# Altium schematic symbol library Electronic Devices_LIB.SchLib: 703 symbols (part 2 of 8) (continued)
## CONN_JST_XH_2P_2.5mm (continued)
XH Series 2.5mm 2 Position Through Hole Shrouded Header Connector; Manufacturer: JST; Current Rating: 3A; Contact Resistance: 20mR; Voltage Rating (AC): 250V; Number of Positions: 2; Insulation Resistance: 1GR; Gender: Male; Wire/Cable Gauge: 22AWG; Manufacturer Part Number: S2B-XH-A(LF)(SN); RoHS: Yes; Category: Headers and Wire Housings; Stock 1: 377; Pricing 1: 1=0.07750, 500=0.07400, 1500=0.07110, 5000=0.06790, 15000=0.06230 (USD); Mount: Through Hole; Contact Material: Brass; Contact Plating: Tin,Lead,Copper; Color: Natural; Housing Color: White; Housing Material: Polyamide; Contact Shape: Square; Contact Finish - Mating: TIN; Insulation Material: Nylon; Insulation Color: Natural; Min Operating Temperature: -25°C; Max Operating Temperature: 85°C; Number of Rows: 1; Voltage Rating: 250V; Termination: Solder; Number of Contacts: 2; Max Current Rating: 3A; Package Quantity: 1000; Packaging: Bulk; Max Voltage Rating (AC): 250V; Max Voltage Rating (DC): 250V; Orientation: Right Angle; Connector Type: Header; Series: XH; Contact Type: Male Pin; Fastening Type: Detent; Length: 7.4mm; Pitch: 2.5mm; Lead Pitch: 2.5mm; Depth: 11.5mm; Reach SVHC Compliant: Yes; Lead Free: Lead Free; Flammability Rating: UL94 V-0; ComponentLink1URL: https://datasheet.ciiva.com/16208/s2b-xh-alfsn-16208978.pdf?src-supplier=Future+Electronics; ComponentLink1Description: https://datasheet.ciiva.com/16208/s2b-xh-alfsn-16208978.pdf?src-supplier=Future+Electronics; ComponentLink2URL: https://datasheet.ciiva.com/26894/getdatasheetpartid-640270-26894603.pdf?src-supplier=Verical; ComponentLink2Description: https://datasheet.ciiva.com/26894/getdatasheetpartid-640270-26894603.pdf?src-supplier=Verical; ComponentLink3URL: https://datasheet.ciiva.com/26894/getdatasheetpartid-441330-26894909.pdf?src-supplier=Verical; ComponentLink3Description: https://datasheet.ciiva.com/26894/getdatasheetpartid-441330-26894909.pdf?src-supplier=Verical; ComponentLink4URL: https://datasheet.ciiva.com/26924/getdatasheetpartid-645395-26924076.pdf?src-supplier=Verical; ComponentLink4Description: https://datasheet.ciiva.com/26924/getdatasheetpartid-645395-26924076.pdf?src-supplier=Verical; ComponentLink5URL: https://datasheet.ciiva.com/8052/1684882-8052211.pdf?src-supplier=Element14; ComponentLink5Description: https://datasheet.ciiva.com/8052/1684882-8052211.pdf?src-supplier=Element14; ComponentLink6URL: https://datasheet.ciiva.com/11746/0900766b8082f560-11746947.pdf?src-supplier=Rs; ComponentLink6Description: https://datasheet.ciiva.com/11746/0900766b8082f560-11746947.pdf?src-supplier=Rs; ComponentLink7URL: https://datasheet.ciiva.com/726/exh-726412.pdf?src-supplier=Digi-Key; ComponentLink7Description: https://datasheet.ciiva.com/726/exh-726412.pdf?src-supplier=Digi-Key; Supplier 1: Future Electronics; Supplier 2: Rs; Supplier 3: Digi-Key; Supplier Part Number 1: 2832053; Supplier Part Number 2: 8201582; Supplier Part Number 3: 455-2257-ND
footprint CONN_JST-S2B-XH-A(LF)(SN)_V (Header, 2-Leads, Body 7.4x11.5mm, Pitch 2.5mm)
pins: 1, 2

## CONN_MICRO_SDCARD_9P
designator J?, comment CONN_SD_CARD 9
CON 9 SD CARD PUSH SMT 1.1MM SP 81H AU; CLASS: IO; AGILE_PN: 211-79878; MFG_NAME01: SHENZHEN ATOM TECHNOLOGY CO.,LTD; MFG_PN01: MR01A-01202; CAD_APPROVED: Yes; PCB Footprint: con9_sdcard_1p1mm; Package Type: SMT; ROHS: Yes; HEIGHT: 2.05 MM
footprint CONN_SDCARD_1P1MM
pins: 1 DAT2, 2 CD/DAT3, 3 CMD, 4 VDD (power), 5 CLK, 6 VSS (power), 7 DAT0, 8 DAT1, 9 DET, 10 GND1 (power), 11 GND2 (power), 12 GND3 (power), 13 GND4 (power)

## CONN_MICROSD_MEM2075-00-140-01-A
designator J?, comment MEM2075-00-140-01-A
Memory Card Connectors Micro SD Push-Push, SMT, 1.40mm Profile, With Peg, Open Switch, T&R; Manufacturer: Global Connector Technology; Supplier 1: Verical; Manufacturer Part Number: MEM2075-00-140-01-A; RoHS: No; Category: Connectors; Stock 1: 1000; Pricing 1: 1000=1.6923 (USD); Mount: Surface Mount; Number of Pins: 8NUMBER; Contact Plating: Gold; Housing Material: 4896ConductorMaterial; Connector Type: Connector; Series: MEM2075; Packaging: Tape and Reel; ComponentLink1URL: https://gct.co/files/drawings/mem2075.pdf?src-supplier=Digikey; ComponentLink1Description: https://gct.co/files/drawings/mem2075.pdf?src-supplier=Digikey; ComponentLink2URL: https://datasheet.octopart.com/MEM2075-00-140-01-A-GCT-datasheet-166929309.pdf?src-supplier=TME; ComponentLink2Description: https://datasheet.octopart.com/MEM2075-00-140-01-A-GCT-datasheet-166929309.pdf?src-supplier=TME; Supplier Part Number 1: MEM2075-00-140-01-A
footprint CONN_MICROSD_GCT_MEM2075-00-140-01-A (0.055" (1.40mm))
pins: P1 DAT2 (io), P2 CD/DAT3 (io), P3 CMD (io), P4 VDD (power), P5 CLK (io), P6 VSS (power), P7 DAT0 (io), P8 DAT1 (io), P9 CD, SH1 SHIELD (power), SH2 SHIELD (power), SH3 SHIELD (power), SH4 SHIELD (power)

## CONN_MINI_SAS_36P_75783-0132
designator J?, comment 75783-0132
Conn I-Pass RCP 36 POS 0.8mm Solder RA SMD 36 Terminal 1 Port Embossed T/R; Manufacturer: Molex; Current Rating: 500mA; Max Voltage Rating (DC): 3.03kV; Contact Resistance: 30mR; Number of Ports: 1; Max Voltage Rating (AC): 30V; Data Rate: 10Gbps; Number of Positions: 36; Connector Type: SATA; Gender: Receptacle; Lead Length: 1.96mm; Supplier 1: Digikey; Manufacturer Part Number: 75783-0132; RoHS: Yes; Category: Card Edge Connectors; Stock 1: 2746; Pricing 1: 1=11.04, 10=9.597 (USD); Mount: Surface Mount; Contact Plating: Gold; Contact Material: Copper Alloy; Housing Color: Black; Color: Black; Housing Material: Thermoplastic; Material: Thermoplastic; Min Operating Temperature: -40°C; Max Operating Temperature: 80°C; Packaging: Tape and Reel; Orientation: Right Angle; Package Quantity: 375; Voltage Rating (AC): 30V; Termination: SMD/SMT; Number of Contacts: 36; Number of Circuits: 36; Number of Rows: 2; Series: 75783; Length: 19.5mm; Pitch: 0.8mm; Depth: 24.07mm; Radiation Hardening: No; Flammability Rating: UL94 V-0; RoHS Compliant: Yes; ELV: Compliant; Halogen Free: Low Halogen; Lead Free: Lead Free; Reach SVHC Compliant: Unknown; ComponentLink1URL: https://datasheet.ciiva.com/5664/0757830132-io-connectors-147998-5664118.pdf?src-supplier=Mouser; ComponentLink1Description: https://datasheet.ciiva.com/5664/0757830132-io-connectors-147998-5664118.pdf?src-supplier=Mouser; Supplier Part Number 1: WM1118CT-ND
footprint CONN_MINI_SAS_757830132 (15.0µin (0.38µm))
pins: A1, A2, A3, A4, A5, A6, A7, A8, A9, A10, A11, A12, A13, A14, A15, A16, A17, A18, B1, B2, B3, B4, B5, B6, B7, B8, B9, B10, B11, B12, B13, B14, B15, B16, B17, B18, SH1, SH2, SH3, SH4, SH5, SH6

## CONN_PC_2P_2.54mm_1702473
designator J?, comment 1702473
Wire-To-Board Terminal Block, 2, 160 V, 6 A, 24 Awg, 20 Awg, 0.5 Mm Rohs Compliant: Yes; Manufacturer: Phoenix Contact; Max Supply Voltage: 150V; Current Rating: 6A; Voltage Rating: 160V; Number of Positions: 2; Number of Levels: 1; Current: 5A; Gender: Male; Wire Gauge (Max): 26AWG; Wire Gauge (Min): 20AWG; Pitch: 2.5mm; Wire/Cable Gauge: 24AWG; Supplier 1: Digi-Key; Manufacturer Part Number: 1702473; RoHS: Yes; Category: Terminal Blocks; Stock 1: 21208; Pricing 1: 1=0.84, 10=0.835 (USD); Mount: Surface Mount; Number of Pins: 2; Material: Polymer; Color: Black; Housing Color: Black; Housing Material: Polymer; Contact Plating: Tin; Contact Material: Tin; Packaging: Tape and Reel; Series: PTSM; Orientation: Right Angle; Max Current Rating: 6A; Number of Rows: 1; Termination: Solder; Number of Positions Per Level: 2; Voltage: 150V; Number of Contacts: 2; Number of Circuits: 2; Length: 5.5mm; Width: 11mm; Height: 9.4mm; Depth: 9.4mm; Radiation Hardening: No; Lead Free: Lead Free; RoHS Compliant: Yes; Flammability Rating: UL94 V-0; Reach SVHC Compliant: Unknown; ComponentLink1URL: https://datasheet.ciiva.com/823/1702473-823756.pdf?src-supplier=Digi-Key; ComponentLink1Description: https://datasheet.ciiva.com/823/1702473-823756.pdf?src-supplier=Digi-Key; ComponentLink2URL: https://datasheet.ciiva.com/11758/0900766b80ecbf39-11758680.pdf?src-supplier=Rs; ComponentLink2Description: https://datasheet.ciiva.com/11758/0900766b80ecbf39-11758680.pdf?src-supplier=Rs; ComponentLink3URL: https://datasheet.ciiva.com/26920/getdatasheetpartid-335746-26920490.pdf?src-supplier=Verical; ComponentLink3Description: https://datasheet.ciiva.com/26920/getdatasheetpartid-335746-26920490.pdf?src-supplier=Verical; ComponentLink4URL: https://datasheet.ciiva.com/16045/1702473-16045904.pdf?src-supplier=Onlinecomponents.com; ComponentLink4Description: https://datasheet.ciiva.com/16045/1702473-16045904.pdf?src-supplier=Onlinecomponents.com; ComponentLink5URL: https://datasheet.ciiva.com/823/1702473-823757.pdf?src-supplier=Digi-Key; ComponentLink5Description: https://datasheet.ciiva.com/823/1702473-823757.pdf?src-supplier=Digi-Key; ComponentLink6URL: https://datasheet.ciiva.com/823/1702473-823758.pdf?src-supplier=Digi-Key; ComponentLink6Description: https://datasheet.ciiva.com/823/1702473-823758.pdf?src-supplier=Digi-Key; ComponentLink7URL: https://datasheet.ciiva.com/14643/70170429-14643773.pdf?src-supplier=Allied+Electronics; ComponentLink7Description: https://datasheet.ciiva.com/14643/70170429-14643773.pdf?src-supplier=Allied+Electronics; ComponentLink8URL: https://datasheet.ciiva.com/29217/569106-da-01-en-printklemme-1702473-770-st-29217643.pdf?src-supplier=Conrad; ComponentLink8Description: https://datasheet.ciiva.com/29217/569106-da-01-en-printklemme-1702473-770-st-29217643.pdf?src-supplier=Conrad; Supplier Part Number 1: 277-2337-1-ND
footprint CONN_PC_2P_1702473 (0.098" (2.50mm))
pins: 1, 2, SH

## CONN_PIN_MALE_1P
designator J?, comment 3325-2-00-15-00-00-03-0
IC & Component Sockets STANDARD I.C. PIN; Manufacturer: Mill-Max; Insulation: Non-Insulated; Supplier 1: Digi-Key; Manufacturer Part Number: 3325-2-00-15-00-00-03-0; RoHS: Yes; Category: Terminals; Stock 1: 9918; Pricing 1: 1=0.34, 10=0.285, 25=0.2516, 50=0.231, 100=0.222, 250=0.19932, 500=0.19026, 1000=0.15854, 2500=0.14496 (USD); Mount: Through Hole; Contact Material: Brass; Contact Plating: Gold; Packaging: Bulk; Termination: Solder; Series: 3325; RoHS Compliant: Yes; ComponentLink1URL: https://datasheet.ciiva.com/18652/3325-2-00-15-00-00-03-0-18652138.pdf?src-supplier=Digi-Key; ComponentLink1Description: https://datasheet.ciiva.com/18652/3325-2-00-15-00-00-03-0-18652138.pdf?src-supplier=Digi-Key; Supplier Part Number 1: ED1138-ND
footprint PIN_TERM_MILL_MAX_3325-0-00-15-00-00-03-0 (Single Post Terminal Connector Through Hole Gold 0.025" (0.64mm) Dia)
pins: 1

## CONN_RF_COAXIAL_59S10H-400T5-Z
designator J?, comment 59S10H-400T5-Z
RF Connectors / Coaxial Connectors FAKRA Straight Plug PCB w/Housing; Manufacturer: Rosenberger; Supplier 1: Mouser; Manufacturer Part Number: 59S10H-400T5-Z; RoHS: No; Stock 1: 2243; Pricing 1: 1=6.96, 10=6.29, 50=6.17, 100=5.24, 200=4.92, 500=4.63, 1000=4.05, 2500=3.85, 10000=4.05 (USD); RoHS Compliant: No; Supplier Part Number 1: 476-59S10H-400T5-Z
footprint CONN_RF_COAXIAL
pins: 1, 2, 3, 4, 5

## CONN_TBLOCK_2P_3.5mm_1-2834011-2
designator J?, comment 1-2834011-2
2POS3.5MMTOPENTRYSCREWLESSC; Manufacturer: TE Connectivity; Current Rating: 6A; Voltage Rating: 300V; Connector Type: Receptacle,Connector; Number of Positions: 2; Sealable: No (Without); Number of Levels: 1; Wire/Cable Gauge: 14AWG; Wire Gauge (Max): 20AWG; Approvals: UL; Supplier 1: Digikey; Manufacturer Part Number: 1-2834011-2; RoHS: Yes; Category: Terminal Blocks; Stock 1: 110419; Pricing 1: 1=0.25, 10=0.209, 25=0.194, 50=0.1832, 100=0.1732, 250=0.16068, 500=0.15182, 1000=0.14552 (USD); Mount: Through Hole; Number of Pins: 2; Contact Plating: Tin,Lead; Color: Green; Housing Material: Nylon; Min Operating Temperature: -40°C; Max Operating Temperature: 105°C; Packaging: Box; Termination: Through Hole; Contact Current Rating: 6A; Series: -; Number of Positions Per Level: 2; Current: 6A; Voltage: 300V; Wire Gauge (Min): 14AWG; Lead Free: Lead Free; RoHS Compliant: Yes; Reach SVHC Compliant: Unknown; ComponentLink1URL: http://www.te.com/commerce/DocumentDelivery/DDEController?Action=srchrtrv&DocNm=1-1773872-7_ModularScrewlessTerminalBloc&DocType=DS&DocLang=English&src-supplier=Digikey; ComponentLink1Description: http://www.te.com/commerce/DocumentDelivery/DDEController?Action=srchrtrv&DocNm=1-1773872-7_ModularScrewlessTerminalBloc&DocType=DS&DocLang=English&src-supplier=Digikey; ComponentLink2URL: https://datasheet.octopart.com/1-2834011-2-TE-Connectivity-datasheet-62069794.pdf?src-supplier=Farnell; ComponentLink2Description: https://datasheet.octopart.com/1-2834011-2-TE-Connectivity-datasheet-62069794.pdf?src-supplier=Farnell; ComponentLink3URL: http://www.farnell.com/datasheets/2296738.pdf?src-supplier=Newark; ComponentLink3Description: http://www.farnell.com/datasheets/2296738.pdf?src-supplier=Newark; ComponentLink4URL: https://datasheet.octopart.com/1-2834011-2-TE-Connectivity-datasheet-77874288.pdf?src-supplier=Element14; ComponentLink4Description: https://datasheet.octopart.com/1-2834011-2-TE-Connectivity-datasheet-77874288.pdf?src-supplier=Element14; Supplier Part Number 1: A123848-ND
footprint CONN_TBLOCK_128340112 (Pitch 3.5mm)
pins: 1, 2

## CONN_TBLOCK_2P_4mm_52/998-404
designator J?, comment 2060-452/998-404
Conn Plug-in Terminal Block 2 POS 4mm Solder RA SMD 9A CAGE CLAMP® Box; Manufacturer: WAGO; Voltage Rating: 160V; Number of Contacts: 2; Wire/Cable Gauge: 24AWG; Stripping Length: -7mm; Supplier 1: Digikey; Manufacturer Part Number: 2060-452/998-404; RoHS: Yes; Category: Terminal Blocks; Stock 1: 73483; Pricing 1: 1=1.29, 10=0.903, 25=0.8424, 50=0.7646, 100=0.7613, 250=0.64288, 500=0.60904 (USD); Color: White; Contact Material: Tin; Material: Copper,Tin; Contact Plating: Tin; Current Rating: 9A; Orientation: Horizontal; Length: 7.9mm; Width: 10.1mm; Height: 4.5mm; Pitch: 4mm; Reach SVHC Compliant: No; Lead Free: Lead Free; Flammability Rating: UL94 V-0; RoHS Compliant: Yes; ComponentLink1URL: http://www.farnell.com/datasheets/2646176.pdf?src-supplier=Farnell; ComponentLink1Description: http://www.farnell.com/datasheets/2646176.pdf?src-supplier=Farnell; ComponentLink2URL: http://www.produktinfo.conrad.com/datenblaetter/1300000-1399999/001361154-da-01-de-SMD_LEITERPLATTENKLEMME_2060_452_998_404.pdf?src-supplier=Conrad; ComponentLink2Description: http://www.produktinfo.conrad.com/datenblaetter/1300000-1399999/001361154-da-01-de-SMD_LEITERPLATTENKLEMME_2060_452_998_404.pdf?src-supplier=Conrad; ComponentLink3URL: http://www.farnell.com/datasheets/1913871.pdf?src-supplier=Element14; ComponentLink3Description: http://www.farnell.com/datasheets/1913871.pdf?src-supplier=Element14; ComponentLink4URL: http://www.farnell.com/datasheets/1965009.pdf?src-supplier=Element14; ComponentLink4Description: http://www.farnell.com/datasheets/1965009.pdf?src-supplier=Element14; ComponentLink5URL: http://www.farnell.com/datasheets/2646176.pdf?src-supplier=Newark; ComponentLink5Description: http://www.farnell.com/datasheets/2646176.pdf?src-supplier=Newark; ComponentLink6URL: https://datasheet.octopart.com/2060-452-998-404-WAGO-datasheet-26529559.pdf?src-supplier=Future+Electronics; ComponentLink6Description: https://datasheet.octopart.com/2060-452-998-404-WAGO-datasheet-26529559.pdf?src-supplier=Future+Electronics; ComponentLink7URL: https://datasheet.octopart.com/2060-452-998-404-WAGO-datasheet-154844926.pdf?src-supplier=Electro+Sonic; ComponentLink7Description: https://datasheet.octopart.com/2060-452-998-404-WAGO-datasheet-154844926.pdf?src-supplier=Electro+Sonic; Supplier Part Number 1: 2946-2060-452/998-404CT-ND
footprint CONN_2P_2060452998404 (Terminal Block Horizontal with Board 0.157" (4.00mm) Surface Mount)
pins: 1 1.1, 2 1.2, 3 2.1, 4 2.2

## CONN_TBLOCK_2P_5.08mm_282837-2
designator J?, comment 282837-2
Connector, Terminal Block; Wire Receptacle; 2 Pos.; 16-30 AWG; 0.2 in. CL; Side;; Manufacturer: TE Connectivity; Plating: Brass; Number of Levels: 1; Number of Positions Per Level: 2; Current: 13.5A; Voltage: 300V; Closed End: No (Without); Interlock: Yes (With); Voltage Rating: 250V; Connector System: Wire-to-Board; Wire Gauge (Max): 28AWG; Wire Gauge (Min): 30AWG; Pitch: 5.08mm; Thread Size: M3; Tail Length: 3.5mm; Supplier 1: Digikey; Manufacturer Part Number: 282837-2; RoHS: Yes; Category: Terminal Blocks; Stock 1: 217371; Pricing 1: 1=0.7, 10=0.681, 25=0.678, 50=0.6552, 100=0.5494, 250=0.51504, 500=0.48644, 1000=0.42635, 5000=0.37199 (USD); Mount: Through Hole; Contact Material: Brass; Contact Plating: Tin; Color: Green; Housing Color: Green; Housing Material: Polyamide; Weight: 0.059966oz; Min Operating Temperature: -40°C; Max Operating Temperature: 110°C; Number of Rows: 1; Packaging: Tray; Package Quantity: 300; Termination: Screw; Number of Positions: 2; Series: Buchanan; Current Rating: 13.5A; Screw Flange: No (Without); Screwless Terminal Block: No (Without); Side Stackable: Yes (With); Max Current Rating: 13.5A; Connector Type: Receptacle; Voltage Rating (AC): 250V; Operating Supply Voltage: 300V; Flammability Rating: UL94 V-0; RoHS Compliant: Yes; ELV: Compliant; Lead Free: Lead Free; Reach SVHC Compliant: Unknown; ComponentLink1URL: https://datasheet.ciiva.com/819/eng-cs-1308389-eurostyle-terminal-blocks-0607-819104.pdf?src-supplier=Avnet; ComponentLink1Description: https://datasheet.ciiva.com/819/eng-cs-1308389-eurostyle-terminal-blocks-0607-819104.pdf?src-supplier=Avnet; ComponentLink2URL: https://datasheet.ciiva.com/11758/0900766b80e7dc97-11758677.pdf?src-supplier=Rs; ComponentLink2Description: https://datasheet.ciiva.com/11758/0900766b80e7dc97-11758677.pdf?src-supplier=Rs; ComponentLink3URL: https://datasheet.ciiva.com/16305/eng-cs-1308389-eurostyle-terminal-blocks-0607-16305248.pdf?src-supplier=Future+Electronics; ComponentLink3Description: https://datasheet.ciiva.com/16305/eng-cs-1308389-eurostyle-terminal-blocks-0607-16305248.pdf?src-supplier=Future+Electronics; ComponentLink4URL: https://datasheet.ciiva.com/19467/750688-19467564.pdf?src-supplier=Jameco; ComponentLink4Description: https://datasheet.ciiva.com/19467/750688-19467564.pdf?src-supplier=Jameco; ComponentLink5URL: https://datasheet.ciiva.com/18620/eng-cd-282837-g3-18620917.pdf?src-supplier=Digikey; ComponentLink5Description: https://datasheet.ciiva.com/18620/eng-cd-282837-g3-18620917.pdf?src-supplier=Digikey; ComponentLink6URL: https://datasheet.ciiva.com/823/eng-cd-282837-g3-823439.pdf?src-supplier=Digikey; ComponentLink6Description: https://datasheet.ciiva.com/823/eng-cd-282837-g3-823439.pdf?src-supplier=Digikey; ComponentLink7URL: https://datasheet.ciiva.com/7978/1650926-7978569.pdf?src-supplier=Element14; ComponentLink7Description: https://datasheet.ciiva.com/7978/1650926-7978569.pdf?src-supplier=Element14; ComponentLink8URL: https://datasheet.ciiva.com/14606/70086281-14606908.pdf?src-supplier=Allied+Electronics; ComponentLink8Description: https://datasheet.ciiva.com/14606/70086281-14606908.pdf?src-supplier=Allied+Electronics; ComponentLink9URL: https://datasheet.ciiva.com/30084/eng-cs-1308389-eurostyle-terminal-blocks-0607-30084269.pdf?src-supplier=Onlinecomponents.com; ComponentLink9Description: https://datasheet.ciiva.com/30084/eng-cs-1308389-eurostyle-terminal-blocks-0607-30084269.pdf?src-supplier=Onlinecomponents.com; Supplier Part Number 1: A113320-ND
footprint CONN_TBLOCK_2P_\2828372
pins: 1, 2

## CONN_TBLOCK_2P_5.08mm_1888687
designator J?, comment 1888687
2 Position Wire to Board Terminal Block Horizontal with Board 0.200" (5.08mm) Through Hole; Manufacturer: Phoenix Contact; Current Rating: 16A; Number of Contacts: 2; Voltage Rating: 400V; Number of Levels: 1; Current: 10A; Voltage: 300V; Connector Type: Screw; Max Supply Voltage: 250V; Gender: Male; Wire Gauge (Max): 30AWG; Wire Gauge (Min): 12AWG; Wire/Cable Gauge: 24AWG; Approvals: UL,VDE,cULus,CB,EAC; Supplier 1: Digikey; Manufacturer Part Number: 1888687; RoHS: Yes; Category: Terminal Blocks; Stock 1: 6446; Pricing 1: 1=1.05, 10=1.004, 50=0.9604, 100=0.9341, 250=0.873, 500=0.81964 (USD); Mount: Through Hole; Number of Pins: 2; Housing Material: Polyamide; Contact Material: Tin; Contact Plating: 154ConductorMaterial; Color: Green; Weight: 0.114993oz; Material: Polyamide; Housing Color: Green; Min Operating Temperature: -40°C; Termination: Screw; Orientation: Straight; Series: COMBICON MKDSN; Number of Rows: 1; Max Current Rating: 16A; Packaging: Bulk; Number of Positions Per Level: 2; Package Quantity: 50; Number of Positions: 2; Number of Circuits: 2; Voltage Rating (AC): 250V; Number of Poles: 2; Length: 11.6mm; Width: 18.5mm; Height: 10.16mm; Depth: 9.5mm; Pitch: 5.08mm; RoHS Compliant: Yes; Reach SVHC Compliant: Unknown; Lead Free: Lead Free; Flammability Rating: UL94 V-0; ComponentLink1URL: https://datasheet.ciiva.com/6751/1888687-6751366.pdf?src-supplier=Digikey; ComponentLink1Description: https://datasheet.ciiva.com/6751/1888687-6751366.pdf?src-supplier=Digikey; ComponentLink2URL: https://datasheet.ciiva.com/5765/528137-5765413.pdf?src-supplier=Farnell; ComponentLink2Description: https://datasheet.ciiva.com/5765/528137-5765413.pdf?src-supplier=Farnell; ComponentLink3URL: https://datasheet.ciiva.com/16047/1888687-16047138.pdf?src-supplier=Onlinecomponents.com; ComponentLink3Description: https://datasheet.ciiva.com/16047/1888687-16047138.pdf?src-supplier=Onlinecomponents.com; ComponentLink4URL: https://datasheet.ciiva.com/29226/774087-da-01-en-printklemme-1888687-250-st-29226666.pdf?src-supplier=Conrad; ComponentLink4Description: https://datasheet.ciiva.com/29226/774087-da-01-en-printklemme-1888687-250-st-29226666.pdf?src-supplier=Conrad; Supplier Part Number 1: 277-5893-ND
footprint CONN_Phoenix_Contact_1888687_MFG (Terminal Block Horizontal with Board 0.200" (5.08mm) Through Hole)
pins: 1, 2

## CONN_TBLOCK_2P_5MM_1824740000
designator J?, comment 1824740000
LCP-Made Terminal Block LSF-SMT 5.00 Series (Weidmuller); Voltage Rating: 300V; Current Rating: 10A; Number of Poles: 2; Number of Levels: 1; Current: 12A; Connector Type: PCB,Terminal Block; Wire Gauge (Max): 24AWG; Wire Gauge (Min): 16AWG; Pitch: 5mm; Hole Diameter: 1.1mm; Stripping Length: 8mm; Approvals: CSA,cURus; Supplier 1: Digikey; Manufacturer: Weidmuller; Manufacturer Part Number: 1824740000; RoHS: Yes; Category: Terminal Blocks; Stock 1: 16851; Pricing 1: 1=1.06, 10=0.747, 25=0.6968, 60=0.63233, 120=0.62958, 300=0.53167, 540=0.50369, 1020=0.44772, 5040=0.39975 (USD); Mount: Through Hole; Contact Plating: Tin; Color: Black; Contact Material: Copper Alloy; Housing Color: Black; Housing Material: Polymer; Min Operating Temperature: -50°C; Max Operating Temperature: 240°C; Number of Rows: 1; Packaging: Rail/Tube; Number of Positions Per Level: 2; Voltage: 300V; Termination: Screwless; Number of Circuits: 2; Number of Contacts: 2; Number of Positions: 2; Orientation: Right Angle; Series: Omnimate LSF-SMT; Wire/Cable Gauge: 24AWG; Radiation Hardening: No; Lead Free: Lead Free; Flammability Rating: UL94 V-0; RoHS Compliant: Yes; Reach SVHC Compliant: No; ComponentLink1URL: https://datasheet.ciiva.com/823/1824740000-823948.pdf?src-supplier=Digikey; ComponentLink1Description: https://datasheet.ciiva.com/823/1824740000-823948.pdf?src-supplier=Digikey; Supplier Part Number 1: 281-2110-ND
footprint CONN_2P_1824740000 (Horizontal with Board 0.197" (5.00mm) Through Hole)
pins: 1, 2, 3, 4

## CONN_TBLOCK_3P_3.5mm_284391-3
designator J?, comment 284391-3
Conn Terminal Block F 3 POS 3.5mm Solder ST Thru-Hole 12A/Contact; Manufacturer: TE Connectivity; Plating: Brass; Current Rating: 12A; Number of Levels: 1; Number of Positions Per Level: 3; Voltage: 300V; Shrouded: Yes (With); Connector Type: Receptacle; Closed End: No (Without); Wire Gauge (Max): 30AWG; Thread Size: M2; Supplier 1: Digikey; Manufacturer Part Number: 284391-3; RoHS: Yes; Category: Terminal Blocks; Stock 1: 43939; Pricing 1: 1=1.33, 10=1.242, 200=1.069, 1000=0.84365, 5000=0.76275, 10000=0.71515 (USD); Mount: Through Hole; Color: Green; Contact Plating: Tin; Contact Material: Brass; Housing Color: Green; Housing Material: Polyamide; Min Operating Temperature: -40°C; Max Operating Temperature: 105°C; Packaging: Box; Termination: Solder; Series: Buchanan; Package Quantity: 200; Number of Rows: 1; Current: 12A; Number of Positions: 3; Number of Circuits: 3; Number of Contacts: 3; Orientation: Straight; Voltage Rating: 300V; Max Voltage Rating (AC): 300V; Max Supply Voltage (AC): 300V; Max Current Rating: 12A; Interlock: Yes (With); Screw Flange: No (Without); Screwless Terminal Block: No (Without); Side Stackable: Yes (With); Length: 11mm; Wire Gauge (Min): 30AWG; Pitch: 3.5mm; Depth: 8.2mm; Tail Length: 3.5mm; Radiation Hardening: No; RoHS Compliant: Yes; ELV: Compliant; Flammability Rating: UL94 V-0; ComponentLink1URL: https://datasheet.ciiva.com/823/eng-cd-284391-b4-823862.pdf?src-supplier=Digikey; ComponentLink1Description: https://datasheet.ciiva.com/823/eng-cd-284391-b4-823862.pdf?src-supplier=Digikey; ComponentLink2URL: https://datasheet.ciiva.com/9370/eng-cs-1308389-eurostyle-terminal-blocks-0607-9370171.pdf?src-supplier=Avnet; ComponentLink2Description: https://datasheet.ciiva.com/9370/eng-cs-1308389-eurostyle-terminal-blocks-0607-9370171.pdf?src-supplier=Avnet; ComponentLink3URL: https://datasheet.ciiva.com/30219/eng-cs-1308389-eurostyle-terminal-blocks-0607-30219943.pdf?src-supplier=Onlinecomponents.com; ComponentLink3Description: https://datasheet.ciiva.com/30219/eng-cs-1308389-eurostyle-terminal-blocks-0607-30219943.pdf?src-supplier=Onlinecomponents.com; Supplier Part Number 1: A98160-ND
footprint CONN_TBLOCK_TE_284391-3
pins: 1, 2, 3

## CONN_UFL_RF_5OR_U.FL-R-SMT-1(10)
designator J?, comment U.FL-R-SMT-1(10)
RF Connector, 1 Contact(s), Male, Board Mount, Surface Mount Terminal, Receptacle; Manufacturer: Hirose; Body Material: Bronze; Body Plating: Silver; Dielectric Material: Polymer; Center Contact Plating: Gold; Impedance: 50R; Connector Type: Receptacle,Male Pin; Max Frequency: 6GHz; Number of Ports: 1; Mating Cycles: 30; Insulation Resistance: 500MR; Supplier 1: Digikey; Manufacturer Part Number: U.FL-R-SMT-1(10); RoHS: Yes; Category: RF / Coaxial Connectors; Stock 1: 174716; Pricing 1: 1=1.26, 10=1.064, 25=1.0208, 50=0.9988, 100=0.9555, 250=0.8686, 500=0.78174, 1000=0.69488 (USD); Mount: Surface Mount; Contact Material: Brass; Housing Color: Beige; Weight: 0.001764oz; Min Operating Temperature: -40°C; Max Operating Temperature: 90°C; Packaging: Tape and Reel; Package Quantity: 2500; Fastening Type: SNAP-ON; Termination: Solder; Series: U.FL; Orientation: Straight; RoHS Compliant: Yes; Lead Free: 5697LeadFree; ComponentLink1URL: https://datasheet.ciiva.com/11762/0900766b8105243f-11762474.pdf?src-supplier=Rs; ComponentLink1Description: https://datasheet.ciiva.com/11762/0900766b8105243f-11762474.pdf?src-supplier=Rs; ComponentLink2URL: https://datasheet.ciiva.com/7651/91524-7651914.pdf?src-supplier=Element14; ComponentLink2Description: https://datasheet.ciiva.com/7651/91524-7651914.pdf?src-supplier=Element14; ComponentLink3URL: https://datasheet.ciiva.com/7651/91524-7651915.pdf?src-supplier=Element14; ComponentLink3Description: https://datasheet.ciiva.com/7651/91524-7651915.pdf?src-supplier=Element14; Supplier Part Number 1: H11891DKR-ND
footprint CONN_UFL_U.FL-R-SMT-1(10)
pins: 1, 2, 3

## CONN_USB_TYPEA_USB1130-15-A
designator J?, comment USB1130-15-A
Usb Conn, 2.0 Type A, R/a Rcpt, 4Pos, Th Rohs Compliant: Yes; Manufacturer: Global Connector Technology; Supplier 1: Verical; Manufacturer Part Number: USB1130-15-A; RoHS: No; Category: Connectors; Stock 1: 439; Pricing 1: 168=0.4883, 250=0.4687 (USD); ComponentLink1URL: https://datasheet.octopart.com/USB1130-15-A-Global-Connector-Technology-datasheet-148834151.pdf?src-supplier=Future+Electronics; ComponentLink1Description: https://datasheet.octopart.com/USB1130-15-A-Global-Connector-Technology-datasheet-148834151.pdf?src-supplier=Future+Electronics; Supplier Part Number 1: USB1130-15-A
footprint CONN_USBA_GCT_USB1130-15-A_REVA
pins: 1 VCC (power), 2 D-, 3 D+, 4 GND (power), S1 SHIELD, S2 SHIELD

## CONN_USB_TYPEC_2.0_16P_12402012E212A
designator J?, comment 12402012E212A
USB-C (USB TYPE-C) USB 2.0 Receptacle Connector 24 (16+8 Dummy) Position Surface Mount, Right Angle; Through Hole; Manufacturer: Amphenol; Supplier 1: Digi-Key; Manufacturer Part Number: 12402012E212A; RoHS: No; Category: Connectors; Stock 1: 12453; Pricing 1: 1=0.99, 10=0.833, 25=0.7988, 50=0.7816, 100=0.7477, 250=0.67972 (USD); Supplier Part Number 1: 664-12402012E212ACT-ND
footprint CONN_USB_C_16P (SMD 16P)
pins: A1_B12 GND (power), A4_B9 VBUS (power), A5 CC1_A, A6 D+_A, A7 D-_A, A8 SBU1, B1_A12 GND (power), B4_A9 VBUS (power), B5 CC1_B, B6 D+_B, B7 D-_B, B8 SBU2, SH1 SHIELD, SH2 SHIELD, SH3 SHIELD, SH4 SHIELD

## CONN_USB_TYPEC_2.0_16P_TYPE-C 16PIN 2MD(073)
designator J?, comment TYPE-C 16PIN 2MD(073)
5A 1 Surface Mount 16P Female -25℃~+85℃ Type-C SMD USB Connectors ROHS; Manufacturer: SHOU HAN; Supplier 1: LCSC; Manufacturer Part Number: TYPE-C 16PIN 2MD(073); RoHS: No; Category: Connectors; Pricing 1: 0.0523 (USD); Supplier Part Number 1: 664-12402012E212ACT-ND
footprint CONN_USB_C_16P (SMD 16P)
pins: A1_B12 GND (power), A4_B9 VBUS (power), A5 CC1_A, A6 D+_A, A7 D-_A, A8 SBU1, B1_A12 GND (power), B4_A9 VBUS (power), B5 CC1_B, B6 D+_B, B7 D-_B, B8 SBU2, SH1 SHIELD, SH2 SHIELD, SH3 SHIELD, SH4 SHIELD

## CONN_USB_TYPEC_3.2_12401945E212A
designator J?, comment 12401945E212A
USB3.2 GEN1, Type C, Top mount, CH 1.53mm, Dual Row SMT / Tap/Rl; Manufacturer: Amphenol ICC / FCI; Supplier 1: Digikey; Manufacturer Part Number: 12401945E212A; RoHS: No; Category: Connectors; Stock 1: 12310; Pricing 1: 1=1.63, 10=1.415, 25=1.3544, 50=1.3242, 100=1.2641, 250=1.14372, 500=1.05342 (USD); Supplier Part Number 1: 664-12401945E212ACT-ND
footprint CONN_USBC_AMPHENOL_12401945E212A (TYPE C 24P)
pins: A1 GND_A (power), A2 TX1+ (io), A3 TX1- (io), A4 VBUS_A (power), A5 CC1 (io), A6 D1+ (io), A7 D1- (io), A8 SBU1 (io), A9 VBUS_A (power), A10 RX2- (io), A11 RX2+ (io), A12 GND_A (power), B1 GND_B (power), B2 TX2+ (io), B3 TX2- (io), B4 VBUS_B (power), B5 CC2 (io), B6 D2+ (io), B7 D2- (io), B8 SBU2 (io), B9 VBUS_B (power), B10 RX1- (io), B11 RX1+ (io), B12 GND_B (power), SH1 SHIELD, SH2 SHIELD, SH3 SHIELD, SH4 SHIELD

## CONN_USB_TYPEC_16P_213716-0001
designator J?, comment 213716-0001
Connector USB Type C Receptacle 16 Position 0.5mm Surface Mount Right Angle Emboss T/R; Manufacturer: Molex; USB Standard: 6108USBStandard; Current Rating: 5A; Gender: 4472Gender; Number of Contacts: 16NUMBER; Voltage Rating: 30V; Supplier 1: Digi-Key; Manufacturer Part Number: 213716-0001; RoHS: No; Category: USB Connectors; Stock 1: 15951; Pricing 1: 1=1.29, 10=1.067, 100=0.8892 (USD); Contact Material: 153,157ConductorMaterial; Min Operating Temperature: -30°C; Max Operating Temperature: 85°C; Height: 3.46mm; Supplier Part Number 1: 900-2137160001CT-ND
footprint CONN_USB_Molex_0_MFG (THT USB)
pins: 1 MNT 1, 2 MNT 2, 3 MNT 3, 4 MNT 4, A1 GND, A4 VBUS, A5 CC1, A6 Dp1, A7 Dn1, A8 SBU1, A9 VBUS, A12 GND, B1 GND, B4 VBUS, B5 CC2, B6 Dp2, B7 Dn2, B8 SBU2, B9 VBUS, B12 GND

## CONN_USB_TYPEC_POWERONLY_6P_UJC-HP-3-SMT-TR
designator J?, comment UJC-HP-3-SMT-TR  Supplier Part Number 2: ESD5B5.0ST1GOSCT-ND
ESD5B5.0S Series 5.8 V 50 W 32 pF SMT ESD Protection Diode - SOD-523; Manufacturer: CUI Devices; Operating Supply Voltage: 5V; Breakdown Voltage: 7.8V; Peak Pulse Power: 50W; Number of Bidirectional Channels: 1; Min Breakdown Voltage: 5.8V; Power Line Protection: No; Max Reverse Leakage Current: 1uA; Max Power Dissipation: 200mW; Diode Type: ZENER; Capacitance: 32pF; Direction: Bidirectional; ESD Protection: Yes; Test Current: 1mA; Peak Pulse Current: 30A; Supplier 1: Digi-Key; Manufacturer Part Number: UJC-HP-3-SMT-TR; RoHS: Yes; Category: USB Connectors; Stock 1: 19137; Pricing 1: 1=1.16, 10=0.977, 25=0.9376, 50=0.9176, 100=0.8777, 250=0.79792, 500=0.71812 (USD); Supplier Part Number 1: 2223-UJC-HP-3-SMT-CT-ND; Supplier 2: Digi-Key; Stock 2: 5727; Pricing 2: 1=0.28, 10=0.19, 100=0.0929, 500=0.0775, 1000=0.05385 (USD); Case/Package: SOD-523-2; Number of Pins: 2; Min Operating Temperature: -55°C; Max Operating Temperature: 150°C; Packaging: Tape and Reel; Package Quantity: 3000; Reverse Standoff Voltage: 5V; Power Dissipation: 50W; Series: -; Number of Channels: 1; Polarity: Bidirectional; Termination: SMD/SMT; Max Breakdown Voltage: 7.8V; Working Voltage: 5V; Leakage Current: 1uA; Number of Lines: 1; Length: 1.2mm; Width: 0.9mm; Height: 0.7mm; Depth: 0.8mm; Radiation Hardening: No; Lead Free: Lead Free; RoHS Compliant: Yes; Reach SVHC Compliant: No; Halogen Free: Halogen Free; ComponentLink1URL: https://datasheet.ciiva.com/339/esd5b5-0st1g-339772.pdf?src-supplier=Avnet; ComponentLink1Description: https://datasheet.ciiva.com/339/esd5b5-0st1g-339772.pdf?src-supplier=Avnet; ComponentLink2URL: https://datasheet.ciiva.com/339/esd5b5-0st1g-339772.pdf?src-supplier=Digi-Key; ComponentLink2Description: https://datasheet.ciiva.com/339/esd5b5-0st1g-339772.pdf?src-supplier=Digi-Key; ComponentLink3URL: https://datasheet.ciiva.com/22637/716649-22637178.pdf?src-supplier=Element14; ComponentLink3Description: https://datasheet.ciiva.com/22637/716649-22637178.pdf?src-supplier=Element14; ComponentLink4URL: https://datasheet.ciiva.com/4510/esd5b5-0st1g-241623-4510548.pdf?src-supplier=Mouser; ComponentLink4Description: https://datasheet.ciiva.com/4510/esd5b5-0st1g-241623-4510548.pdf?src-supplier=Mouser; ComponentLink5URL: https://datasheet.ciiva.com/339/esd5b5-0st1-d-339773.pdf?src-supplier=Digi-Key; ComponentLink5Description: https://datasheet.ciiva.com/339/esd5b5-0st1-d-339773.pdf?src-supplier=Digi-Key; ComponentLink6URL: https://datasheet.ciiva.com/339/esd5b5-0st1-d-339774.pdf?src-supplier=Digi-Key; ComponentLink6Description: https://datasheet.ciiva.com/339/esd5b5-0st1-d-339774.pdf?src-supplier=Digi-Key
footprint CONN_USB_TC_CUI_UJC-HP-3-SMT-TR (Receptacle Connector 24 (6+18 Dummy) Position Surface Mount, Right Angle; Through Hole)
pins: A5 CC1 (io), A9 V-BUS (power), A12 GND (power), B5 CC2 (io), B9 V-BUS (power), B12 GND (power), S1 SHIELD, S2 SHIELD, S3 SHIELD, S4 SHIELD

## CONN_USB_TYPEC_POWERONLY_  TYPE-C 6P(073)
designator J?, comment TYPE-C 6P(073)
5A 1 Surface Mount 6P Female -25℃~+85℃ Type-C SMD USB Connectors ROHS; Manufacturer: SHOU HAN; Manufacturer Part Number: TYPE-C 6P(073); Supplier 1: LCSC; ComponentLink1Description: Link Supplier; ComponentLink1URL: https://www.lcsc.com/product-detail/USB-Connectors_SHOU-HAN-TYPE-C-6P-073_C668623.html; Supplier 2: Digi-Key; Supplier Part Number 2: 311-5.10KHRCT-ND
footprint CONN_USB_TC_CUI_UJC-HP-3-SMT-TR (Receptacle Connector 24 (6+18 Dummy) Position Surface Mount, Right Angle; Through Hole)
pins: A5 CC1 (io), A9 V-BUS (power), A12 GND (power), B5 CC2 (io), B9 V-BUS (power), B12 GND (power), S1 SHIELD, S2 SHIELD, S3 SHIELD, S4 SHIELD

## CPU_BOARD_MODEL
designator U?
footprint CPU_MODEL

## CRISTAL_ABLS_6.7458MHZ
designator Y?, comment Frequency: 6.7458MHz  (hidden comment: ABLSG-6.7458MHZ-D-2-Y-T)
Crystal 6.7458MHz ±20ppm (Tol) ±30ppm (Stability) 18pF FUND 100Ohm 3-Pin HC-49/US SMD T/R; Manufacturer: Abracon; ESR (Equivalent Series Resistance): 100R; Supplier 1: Verical; Manufacturer Part Number: ABLSG-6.7458MHZ-D-2-Y-T; RoHS: Yes; Category: Crystals; Stock 1: 888; Pricing 1: 296=0.224 (USD); Mount: Surface Mount; Case/Package: SMD/SMT; Number of Pins: 3; Min Operating Temperature: -40°C; Max Operating Temperature: 85°C; Frequency Tolerance: 20ppm; Load Capacitance: 18pF; Package Quantity: 1; Tolerance: 20ppm; Packaging: Tape and Reel; Frequency Stability: 30ppm; Termination: SMD/SMT; Series Resistance: 100R; Series: ABLSG; Length: 0.449inch; Width: 0.185inch; Height: 0.165inch; Radiation Hardening: No; RoHS Compliant: Yes; Reach SVHC Compliant: Unknown; ComponentLink1URL: https://datasheet.ciiva.com/3175/ablsg-3175597.pdf?src-supplier=Avnet; ComponentLink1Description: https://datasheet.ciiva.com/3175/ablsg-3175597.pdf?src-supplier=Avnet; ComponentLink2URL: https://datasheet.ciiva.com/23689/1883672-23689320.pdf?src-supplier=Newark; ComponentLink2Description: https://datasheet.ciiva.com/23689/1883672-23689320.pdf?src-supplier=Newark; Supplier Part Number 1: ABLSG-6.7458MHZ-D-2-Y-T
footprint CRYSTAL_ABLSG-6.7458MHZ (0.449" L x 0.185" W (11.40mm x 4.70mm))
pins: 1 OSC1, 2 OSC2, 3 GND

## CRYSTAL_24MHZ_12pF_FA-238 24.0000MD30X-W5
designator X?, comment FA-238 24.0000MD30X-W5
Crystal 24MHz 12pF 4-Pin SMD T/R; Manufacturer: Epson; ESR (Equivalent Series Resistance): 60R; Frequency Stability: 30ppm; Supplier 1: Digikey; Manufacturer Part Number: FA-238 24.0000MD30X-W5; RoHS: Yes; Category: Crystals; Stock 1: 41041; Pricing 1: 1=0.55, 10=0.474, 50=0.4274, 100=0.4087, 500=0.36858, 1000=0.35261, 3000=0.26302, 6000=0.2517, 9000=0.24532, 15000=0.23752, 21000=0.2375 (USD); Mount: Surface Mount; Case/Package: SMD/SMT; Number of Pins: 4; Min Operating Temperature: -40°C; Max Operating Temperature: 85°C; Packaging: Tape and Reel; Frequency: 24MHz; Load Capacitance: 12pF; Frequency Tolerance: 30ppm; Series: FA-238; Length: 0.126inch; Width: 0.098inch; Height: 0.028inch; ComponentLink1URL: https://support.epson.biz/td/api/doc_check.php?dl=brief_FA-238&amp;lang=en&src-supplier=Digikey; ComponentLink1Description: https://support.epson.biz/td/api/doc_check.php?dl=brief_FA-238&amp;lang=en&src-supplier=Digikey; ComponentLink2URL: https://support.epson.biz/td/api/doc_check.php?dl=brief_FA-238V_en.pdf&src-supplier=Digikey; ComponentLink2Description: https://support.epson.biz/td/api/doc_check.php?dl=brief_FA-238V_en.pdf&src-supplier=Digikey; ComponentLink3URL: http://www.epsondevice.com/docs/qd/en/DownloadServlet?id=ID000658&src-supplier=Avnet; ComponentLink3Description: http://www.epsondevice.com/docs/qd/en/DownloadServlet?id=ID000658&src-supplier=Avnet; Supplier Part Number 1: SER4252CT-ND
footprint CRYSTAL_XTAL_FA-238_24.0000MD30X-W5
pins: 1 XTAL_1, 2 GND_1, 3 XTAL_2, 4 GND_2

## CRYSTAL_38.4MHz_10pF_402F38411CAR
designator Y?, comment Frequency: 38.4MHz  (hidden comment: 402F38411CAR)
Crystal 38.4MHz ±10ppm (Tol) ±10ppm (Stability) 10pF FUND 60Ohm 4-Pin SMD T/R; Manufacturer: CTS; ESR (Equivalent Series Resistance): 100R; Supplier 1: Digikey; Manufacturer Part Number: 402F38411CAR; RoHS: Yes; Category: Crystals; Stock 1: 38912; Pricing 1: 1=0.7, 10=0.618, 50=0.5776, 100=0.5105, 500=0.48358, 1000=0.40299 (USD); Mount: Surface Mount; Case/Package: SMD/SMT; Contact Plating: Gold; Min Operating Temperature: -20°C; Max Operating Temperature: 70°C; Packaging: Tape and Reel; Termination: SMD/SMT; Series: 402; Frequency Tolerance: 10ppm; Load Capacitance: 10pF; Tolerance: 10ppm; Frequency Stability: 10ppm; Series Resistance: 100R; Package Quantity: 3000; Length: 0.079inch; Width: 1.6mm; Height: 0.022inch; RoHS Compliant: Yes; ComponentLink1URL: https://datasheet.ciiva.com/48471/008-0330-0-48471301.pdf?src-supplier=Avnet; ComponentLink1Description: https://datasheet.ciiva.com/48471/008-0330-0-48471301.pdf?src-supplier=Avnet; Supplier Part Number 1: CTX1354CT-ND
footprint CRYSTAL_38.4MHz_402F38411CAR (0.079" L x 0.063" W (2.00mm x 1.60mm))
pins: 1 XTAL_1, 2 GND_1, 3 XTAL_2, 4 GND_2

## CRYSTAL_40MHz_6pF_ABM12W-40.0000MHZ-6-B1U-T3
designator Y?, comment ABM12W-40.0000MHZ-6-B1U-T3  (value not drawn)
Crystal 40MHz ±10ppm (Tol) ±10ppm (Stability) 6pF FUND 80Ohm 4-Pin SMD T/R; Manufacturer: Abracon; Supplier 1: Digi-Key; Manufacturer Part Number: ABM12W-40.0000MHZ-6-B1U-T3; RoHS: Yes; Category: Crystals; Stock 1: 33439; Pricing 1: 1=0.77, 10=0.685, 50=0.6402, 100=0.5657, 500=0.53596, 1000=0.44664 (USD); ComponentLink1URL: https://abracon.com/Resonators/ABM12W.pdf?src-supplier=Digi-Key; ComponentLink1Description: https://abracon.com/Resonators/ABM12W.pdf?src-supplier=Digi-Key; ComponentLink2URL: https://datasheet.octopart.com/ABM12W-40.0000MHZ-6-B1U-T3-Abracon-datasheet-102760956.pdf?src-supplier=Sager+Electronics; ComponentLink2Description: https://datasheet.octopart.com/ABM12W-40.0000MHZ-6-B1U-T3-Abracon-datasheet-102760956.pdf?src-supplier=Sager+Electronics; Supplier Part Number 1: 535-13987-1-ND
footprint CRYSTAL_40M_ABM12W300000MHZ6B1UT3 (0.063" L x 0.047" W (1.60mm x 1.20mm))
pins: 1 XTAL_1, 2 GND_1, 3 XTAL_2, 4 GND_2

## CRYSTAL_ABLS-16.000MHZ
designator Y?, comment Frequency: 16MHz  (hidden comment: ABLS-16.000MHZ-20-B-3-H-T)
Crystal 16MHz ±25ppm (Tol) ±35ppm (Stability) 20pF FUND 40Ohm 2-Pin HC-49/US SMD T/R; Manufacturer: Abracon; Manufacturer Part Number: ABLS-16.000MHZ-20-B-3-H-T; RoHS: Yes; Category: Crystals; Stock 1: 6305; Pricing 1: 1=0.18000, 10=0.14800, 50=0.13280, 100=0.11800, 500=0.11212 (USD); Supplier 1: Digi-Key; Supplier 2: Newark; Supplier 3: Mouser; Supplier Part Number 1: 535-14881-1-ND; Supplier Part Number 2: 01AH8893; Supplier Part Number 3: 815-LS16000MHZ20B3HT
footprint CRYSTAL_ABLS-16.000MHz-20-B-3-H-T
pins: 1 OSC1, 2 OSC2
